# Altium footprint library ref-packages.PCBLIB: 1543 footprints (part 33 of 103)
Each footprint in its own frame and in the unit in brackets; x right, y up, seen from the top. Pads: shape width x height; smd on the part's side, far side on the other; paste and mask are expansions set on the pad; w line width, h text height; cw(c..) or ccw(c..) is an arc to the next point about the centre after c.
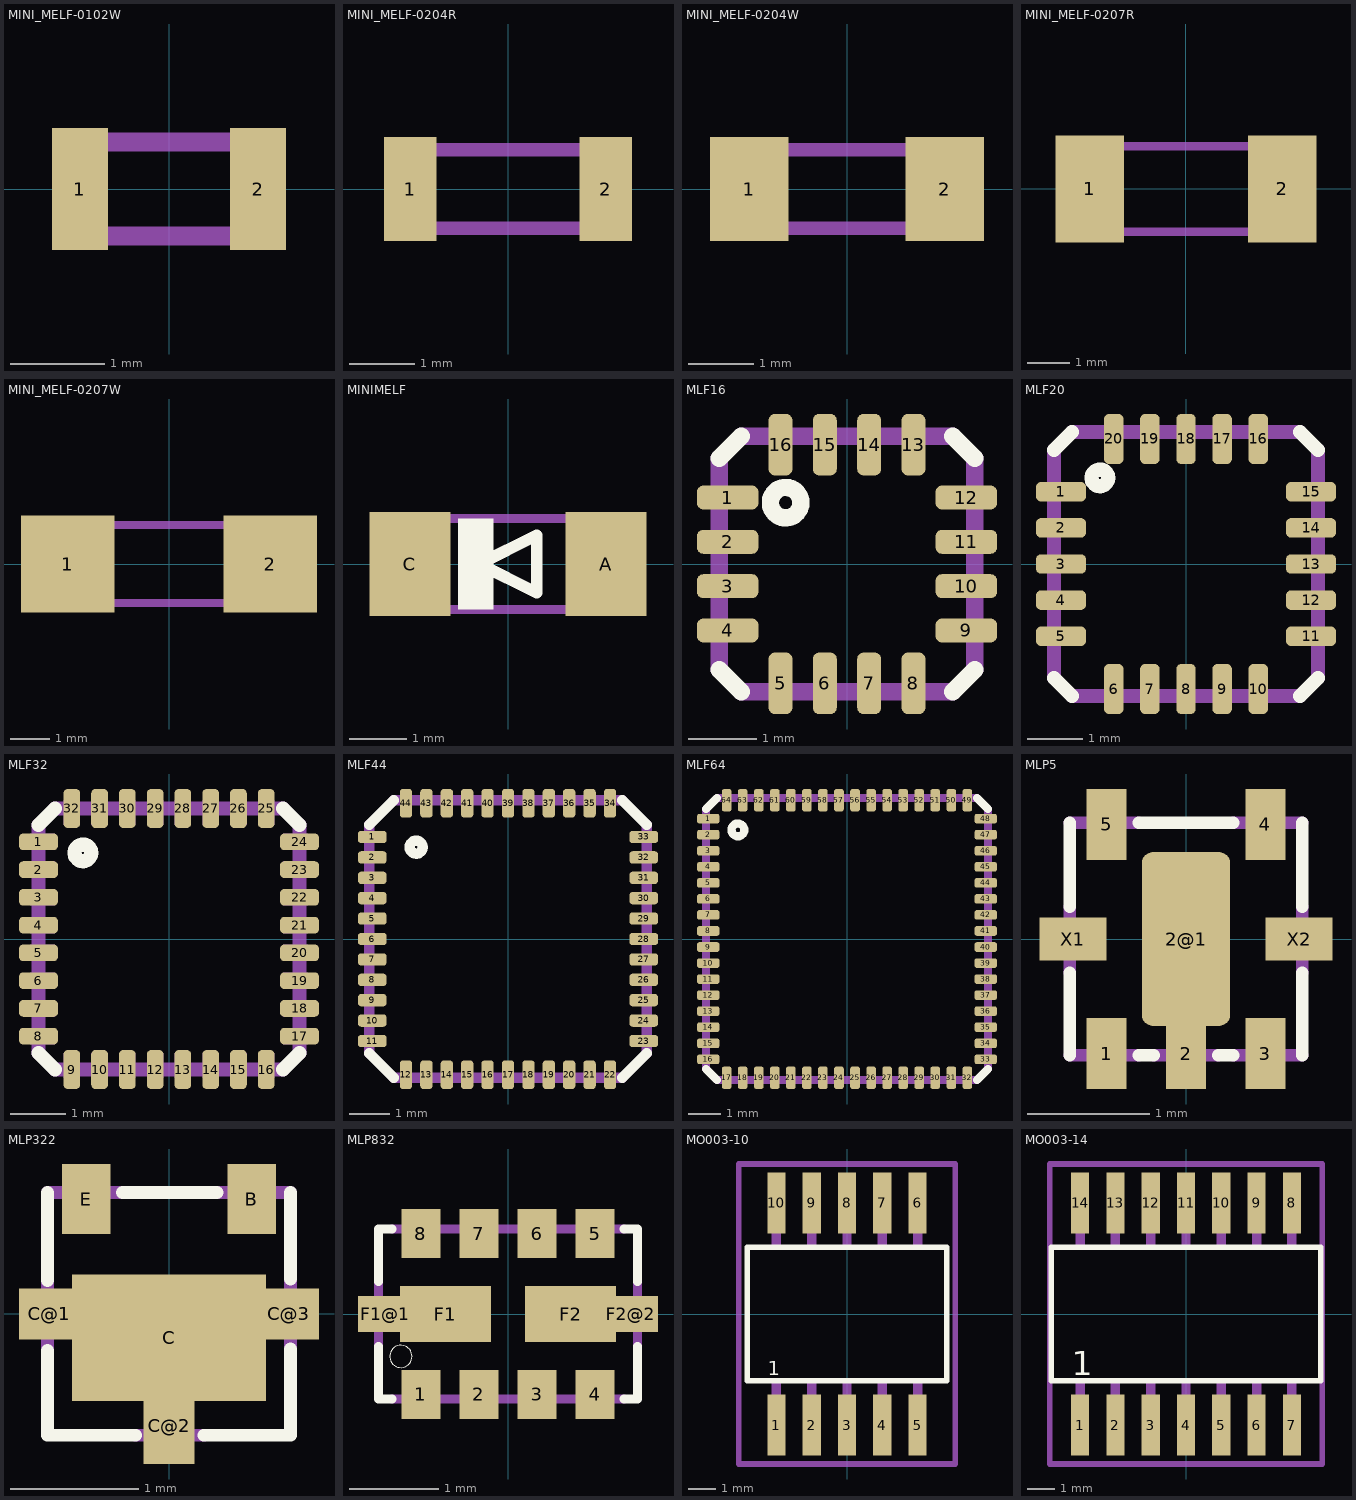
[diagram p32: the footprints below, top view; thin cyan lines are the x and y axes]

## MINI_MELF-0102W [mil]
pads (2):
  rect 23.62x51.18 smd: 1(-37.4,0) 2(37.4,0)
Mechanical 16:
  lines w8: -39.37,-19.69 39.37,-19.69 39.37,19.69 -39.37,19.69 -39.37,-19.69

## MINI_MELF-0204R [mil]
pads (2):
  rect 31.5x62.99 smd: 1(-59.06,0) 2(59.06,0)
Mechanical 16:
  lines w8: -66.93,-23.62 66.93,-23.62 66.93,23.62 -66.93,23.62 -66.93,-23.62

## MINI_MELF-0204W [mil]
pads (2):
  rect 47.24x62.99 smd: 1(-59.06,0) 2(59.06,0)
Mechanical 16:
  lines w8: -66.93,-23.62 66.93,-23.62 66.93,23.62 -66.93,23.62 -66.93,-23.62

## MINI_MELF-0207R [mil]
pads (2):
  rect 62.99x98.43 smd: 1(-88.58,0) 2(88.58,0)
Mechanical 16:
  lines w8: -110.24,-39.37 110.24,-39.37 110.24,39.37 -110.24,39.37 -110.24,-39.37

## MINI_MELF-0207W [mil]
pads (2):
  rect 94.49x98.43 smd: 1(-102.36,0) 2(102.36,0)
Mechanical 16:
  lines w8: -110.24,-39.37 110.24,-39.37 110.24,39.37 -110.24,39.37 -110.24,-39.37

## MINIMELF [mil]
pads (2):
  rect 55.12x70.87 smd: A(66.93,0) C(-66.93,0)
Top Overlay:
  rectangle: -34,-31 -10,31
  lines w8: -19.69,0 19.69,19.69 19.69,-19.69 -19.69,0
Mechanical 16:
  rectangle: -73,-34 -51,34
  rectangle: 51,-34 73,34
  lines w6: -52,-31 52,-31 ; -52,31 52,31

## MLF16 [mm]
pads (16):
  rrect50% 0.9x0.35 smd: 1(-1.75,0.975) 2(-1.75,0.325) 3(-1.75,-0.325) 4(-1.75,-0.975) 9(1.75,-0.975) 10(1.75,-0.325) 11(1.75,0.325) 12(1.75,0.975)
  rrect50% 0.35x0.9 smd: 5(-0.975,-1.75) 6(-0.325,-1.75) 7(0.325,-1.75) 8(0.975,-1.75) 13(0.975,1.75) 14(0.325,1.75) 15(-0.325,1.75) 16(-0.975,1.75)
Top Overlay:
  circle w0.254: c-0.9,0.9 r0.224
  lines w0.254: -1.875,-1.55 -1.55,-1.875 ; -1.875,1.55 -1.55,1.875 ; 1.55,-1.875 1.875,-1.55 ; 1.55,1.875 1.875,1.55
Mechanical 16:
  rectangle: -1.85,0.825 -1.4,1.125
  rectangle: -1.85,0.175 -1.4,0.475
  rectangle: -1.85,-0.475 -1.4,-0.175
  rectangle: -1.85,-1.125 -1.4,-0.825
  rectangle: -1.125,-1.85 -0.825,-1.4
  rectangle: -0.475,-1.85 -0.175,-1.4
  rectangle: 0.175,-1.85 0.475,-1.4
  rectangle: 0.825,-1.85 1.125,-1.4
  rectangle: 1.4,-1.125 1.85,-0.825
  rectangle: 1.4,-0.475 1.85,-0.175
  rectangle: 1.4,0.175 1.85,0.475
  rectangle: 1.4,0.825 1.85,1.125
  rectangle: 0.825,1.4 1.125,1.85
  rectangle: 0.175,1.4 0.475,1.85
  rectangle: -0.475,1.4 -0.175,1.85
  rectangle: -1.125,1.4 -0.825,1.85
  lines w0.254: -1.875,-1.55 -1.875,1.55 ; -1.55,-1.875 1.55,-1.875 ; -1.55,1.875 1.55,1.875 ; 1.875,-1.55 1.875,1.55

## MLF20 [mm]
pads (20):
  rrect50% 0.9x0.35 smd: 1(-2.25,1.3) 2(-2.25,0.65) 3(-2.25,0) 4(-2.25,-0.65) 5(-2.25,-1.3) 11(2.25,-1.3) 12(2.25,-0.65) 13(2.25,0) 14(2.25,0.65) 15(2.25,1.3)
  rrect50% 0.35x0.9 smd: 6(-1.3,-2.25) 7(-0.65,-2.25) 8(0,-2.25) 9(0.65,-2.25) 10(1.3,-2.25) 16(1.3,2.25) 17(0.65,2.25) 18(0,2.25) 19(-0.65,2.25) 20(-1.3,2.25)
Top Overlay:
  circle w0.254: c-1.55,1.55 r0.15
  lines w0.254: -2.375,-2.05 -2.05,-2.375 ; -2.375,2.05 -2.05,2.375 ; 2.05,-2.375 2.375,-2.05 ; 2.05,2.375 2.375,2.05
Mechanical 16:
  rectangle: -2.35,1.15 -1.9,1.45
  rectangle: -2.35,0.5 -1.9,0.8
  rectangle: -2.35,-0.15 -1.9,0.15
  rectangle: -2.35,-0.8 -1.9,-0.5
  rectangle: -2.35,-1.45 -1.9,-1.15
  rectangle: -1.45,-2.35 -1.15,-1.9
  rectangle: -0.8,-2.35 -0.5,-1.9
  rectangle: -0.15,-2.35 0.15,-1.9
  rectangle: 0.5,-2.35 0.8,-1.9
  rectangle: 1.15,-2.35 1.45,-1.9
  rectangle: 1.9,-1.45 2.35,-1.15
  rectangle: 1.9,-0.8 2.35,-0.5
  rectangle: 1.9,-0.15 2.35,0.15
  rectangle: 1.9,0.5 2.35,0.8
  rectangle: 1.9,1.15 2.35,1.45
  rectangle: 1.15,1.9 1.45,2.35
  rectangle: 0.5,1.9 0.8,2.35
  rectangle: -0.15,1.9 0.15,2.35
  rectangle: -0.8,1.9 -0.5,2.35
  rectangle: -1.45,1.9 -1.15,2.35
  lines w0.254: -2.375,-2.05 -2.375,2.05 ; -2.05,-2.375 2.05,-2.375 ; -2.05,2.375 2.05,2.375 ; 2.375,-2.05 2.375,2.05

## MLF32 [mm]
pads (32):
  rrect50% 0.7x0.3 smd: 1(-2.35,1.75) 2(-2.35,1.25) 3(-2.35,0.75) 4(-2.35,0.25) 5(-2.35,-0.25) 6(-2.35,-0.75) 7(-2.35,-1.25) 8(-2.35,-1.75) 17(2.35,-1.75) 18(2.35,-1.25) 19(2.35,-0.75) 20(2.35,-0.25) 21(2.35,0.25) 22(2.35,0.75) 23(2.35,1.25) 24(2.35,1.75)
  rrect50% 0.3x0.7 smd: 9(-1.75,-2.35) 10(-1.25,-2.35) 11(-0.75,-2.35) 12(-0.25,-2.35) 13(0.25,-2.35) 14(0.75,-2.35) 15(1.25,-2.35) 16(1.75,-2.35) 25(1.75,2.35) 26(1.25,2.35) 27(0.75,2.35) 28(0.25,2.35) 29(-0.25,2.35) 30(-0.75,2.35) 31(-1.25,2.35) 32(-1.75,2.35)
Top Overlay:
  circle w0.254: c-1.55,1.55 r0.15
  lines w0.254: -2.35,-2.05 -2.05,-2.35 ; -2.35,2.05 -2.05,2.35 ; 2.05,-2.35 2.35,-2.05 ; 2.05,2.35 2.35,2.05
Mechanical 16:
  rectangle: -2.5,1.6 -2.05,1.9
  rectangle: -2.5,1.1 -2.05,1.4
  rectangle: -2.5,0.6 -2.05,0.9
  rectangle: -2.5,0.1 -2.05,0.4
  rectangle: -2.5,-0.4 -2.05,-0.1
  rectangle: -2.5,-0.9 -2.05,-0.6
  rectangle: -2.5,-1.4 -2.05,-1.1
  rectangle: -2.5,-1.9 -2.05,-1.6
  rectangle: -1.9,-2.5 -1.6,-2.05
  rectangle: -1.4,-2.5 -1.1,-2.05
  rectangle: -0.9,-2.5 -0.6,-2.05
  rectangle: -0.4,-2.5 -0.1,-2.05
  rectangle: 0.1,-2.5 0.4,-2.05
  rectangle: 0.6,-2.5 0.9,-2.05
  rectangle: 1.1,-2.5 1.4,-2.05
  rectangle: 1.6,-2.5 1.9,-2.05
  rectangle: 2.05,-1.9 2.5,-1.6
  rectangle: 2.05,-1.4 2.5,-1.1
  rectangle: 2.05,-0.9 2.5,-0.6
  rectangle: 2.05,-0.4 2.5,-0.1
  rectangle: 2.05,0.1 2.5,0.4
  rectangle: 2.05,0.6 2.5,0.9
  rectangle: 2.05,1.1 2.5,1.4
  rectangle: 2.05,1.6 2.5,1.9
  rectangle: 1.6,2.05 1.9,2.5
  rectangle: 1.1,2.05 1.4,2.5
  rectangle: 0.6,2.05 0.9,2.5
  rectangle: 0.1,2.05 0.4,2.5
  rectangle: -0.4,2.05 -0.1,2.5
  rectangle: -0.9,2.05 -0.6,2.5
  rectangle: -1.4,2.05 -1.1,2.5
  rectangle: -1.9,2.05 -1.6,2.5
  lines w0.254: -2.35,-2.05 -2.35,2.05 ; -2.05,-2.35 2.05,-2.35 ; -2.05,2.35 2.05,2.35 ; 2.35,-2.05 2.35,2.05

## MLF44 [mm]
pads (44):
  rrect50% 0.7x0.3 smd: 1(-3.325,2.5) 2(-3.325,2) 3(-3.325,1.5) 4(-3.325,1) 5(-3.325,0.5) 6(-3.325,0) 7(-3.325,-0.5) 8(-3.325,-1) 9(-3.325,-1.5) 10(-3.325,-2) 11(-3.325,-2.5) 23(3.325,-2.5) 24(3.325,-2) 25(3.325,-1.5) 26(3.325,-1) 27(3.325,-0.5) 28(3.325,0) 29(3.325,0.5) 30(3.325,1) 31(3.325,1.5) 32(3.325,2) 33(3.325,2.5)
  rrect50% 0.3x0.7 smd: 12(-2.5,-3.325) 13(-2,-3.325) 14(-1.5,-3.325) 15(-1,-3.325) 16(-0.5,-3.325) 17(0,-3.325) 18(0.5,-3.325) 19(1,-3.325) 20(1.5,-3.325) 21(2,-3.325) 22(2.5,-3.325) 34(2.5,3.325) 35(2,3.325) 36(1.5,3.325) 37(1,3.325) 38(0.5,3.325) 39(0,3.325) 40(-0.5,3.325) 41(-1,3.325) 42(-1.5,3.325) 43(-2,3.325) 44(-2.5,3.325)
Top Overlay:
  circle w0.254: c-2.25,2.25 r0.158
  lines w0.254: -3.4,-2.8 -2.8,-3.4 ; -3.4,2.8 -2.8,3.4 ; 2.8,-3.4 3.4,-2.8 ; 2.8,3.4 3.4,2.8
Mechanical 16:
  rectangle: -3.5,2.375 -3,2.625
  rectangle: -3.5,1.875 -3,2.125
  rectangle: -3.5,1.375 -3,1.625
  rectangle: -3.5,0.875 -3,1.125
  rectangle: -3.5,0.375 -3,0.625
  rectangle: -3.5,-0.125 -3,0.125
  rectangle: -3.5,-0.625 -3,-0.375
  rectangle: -3.5,-1.125 -3,-0.875
  rectangle: -3.5,-1.625 -3,-1.375
  rectangle: -3.5,-2.125 -3,-1.875
  rectangle: -3.5,-2.625 -3,-2.375
  rectangle: -2.625,-3.5 -2.375,-3
  rectangle: -2.125,-3.5 -1.875,-3
  rectangle: -1.625,-3.5 -1.375,-3
  rectangle: -1.125,-3.5 -0.875,-3
  rectangle: -0.625,-3.5 -0.375,-3
  rectangle: -0.125,-3.5 0.125,-3
  rectangle: 0.375,-3.5 0.625,-3
  rectangle: 0.875,-3.5 1.125,-3
  rectangle: 1.375,-3.5 1.625,-3
  rectangle: 1.875,-3.5 2.125,-3
  rectangle: 2.375,-3.5 2.625,-3
  rectangle: 3,-2.625 3.5,-2.375
  rectangle: 3,-2.125 3.5,-1.875
  rectangle: 3,-1.625 3.5,-1.375
  rectangle: 3,-1.125 3.5,-0.875
  rectangle: 3,-0.625 3.5,-0.375
  rectangle: 3,-0.125 3.5,0.125
  rectangle: 3,0.375 3.5,0.625
  rectangle: 3,0.875 3.5,1.125
  rectangle: 3,1.375 3.5,1.625
  rectangle: 3,1.875 3.5,2.125
  rectangle: 3,2.375 3.5,2.625
  rectangle: 2.375,3 2.625,3.5
  rectangle: 1.875,3 2.125,3.5
  rectangle: 1.375,3 1.625,3.5
  rectangle: 0.875,3 1.125,3.5
  rectangle: 0.375,3 0.625,3.5
  rectangle: -0.125,3 0.125,3.5
  rectangle: -0.625,3 -0.375,3.5
  rectangle: -1.125,3 -0.875,3.5
  rectangle: -1.625,3 -1.375,3.5
  rectangle: -2.125,3 -1.875,3.5
  rectangle: -2.625,3 -2.375,3.5
  lines w0.254: -3.4,-2.8 -3.4,2.8 ; -2.8,-3.4 2.8,-3.4 ; -2.8,3.4 2.8,3.4 ; 3.4,-2.8 3.4,2.8

## MLF64 [mil]
pads (64):
  rrect50% 27.56x11.81 smd: 1(-170.28,147.64) 2(-170.28,127.95) 3(-170.28,108.27) 4(-170.28,88.58) 5(-170.28,68.9) 6(-170.28,49.21) 7(-170.28,29.53) 8(-170.28,9.84) 9(-170.28,-9.84) 10(-170.28,-29.53) 11(-170.28,-49.21) 12(-170.28,-68.9) 13(-170.28,-88.58) 14(-170.28,-108.27) 15(-170.28,-127.95) 16(-170.28,-147.64) 33(170.28,-147.64) 34(170.28,-127.95) 35(170.28,-108.27) 36(170.28,-88.58) 37(170.28,-68.9) 38(170.28,-49.21) 39(170.28,-29.53) 40(170.28,-9.84) 41(170.28,9.84) 42(170.28,29.53) 43(170.28,49.21) 44(170.28,68.9) 45(170.28,88.58) 46(170.28,108.27) 47(170.28,127.95) 48(170.28,147.64)
  rrect50% 11.81x27.56 smd: 17(-147.64,-170.28) 18(-127.95,-170.28) 19(-108.27,-170.28) 20(-88.58,-170.28) 21(-68.9,-170.28) 22(-49.21,-170.28) 23(-29.53,-170.28) 24(-9.84,-170.28) 25(9.84,-170.28) 26(29.53,-170.28) 27(49.21,-170.28) 28(68.9,-170.28) 29(88.58,-170.28) 30(108.27,-170.28) 31(127.95,-170.28) 32(147.64,-170.28) 49(147.64,170.28) 50(127.95,170.28) 51(108.27,170.28) 52(88.58,170.28) 53(68.9,170.28) 54(49.21,170.28) 55(29.53,170.28) 56(9.84,170.28) 57(-9.84,170.28) 58(-29.53,170.28) 59(-49.21,170.28) 60(-68.9,170.28) 61(-88.58,170.28) 62(-108.27,170.28) 63(-127.95,170.28) 64(-147.64,170.28)
Top Overlay:
  circle w10: c-133.86,133.86 r7.87
  lines w10: -173.23,-159.45 -159.45,-173.23 ; -173.23,159.45 -159.45,173.23 ; 159.45,-173.23 173.23,-159.45 ; 159.45,173.23 173.23,159.45
Mechanical 16:
  rectangle: -177.17,142.72 -157.48,152.56
  rectangle: -177.17,123.03 -157.48,132.87
  rectangle: -177.17,103.35 -157.48,113.19
  rectangle: -177.17,83.66 -157.48,93.5
  rectangle: -177.17,63.98 -157.48,73.82
  rectangle: -177.17,44.29 -157.48,54.13
  rectangle: -177.17,24.61 -157.48,34.45
  rectangle: -177.17,4.92 -157.48,14.76
  rectangle: -177.17,-14.76 -157.48,-4.92
  rectangle: -177.17,-34.45 -157.48,-24.61
  rectangle: -177.17,-54.13 -157.48,-44.29
  rectangle: -177.17,-73.82 -157.48,-63.98
  rectangle: -177.17,-93.5 -157.48,-83.66
  rectangle: -177.17,-113.19 -157.48,-103.35
  rectangle: -177.17,-132.87 -157.48,-123.03
  rectangle: -177.17,-152.56 -157.48,-142.72
  rectangle: -152.56,-177.17 -142.72,-157.48
  rectangle: -132.87,-177.17 -123.03,-157.48
  rectangle: -113.19,-177.17 -103.35,-157.48
  rectangle: -93.5,-177.17 -83.66,-157.48
  rectangle: -73.82,-177.17 -63.98,-157.48
  rectangle: -54.13,-177.17 -44.29,-157.48
  rectangle: -34.45,-177.17 -24.61,-157.48
  rectangle: -14.76,-177.17 -4.92,-157.48
  rectangle: 4.92,-177.17 14.76,-157.48
  rectangle: 24.61,-177.17 34.45,-157.48
  rectangle: 44.29,-177.17 54.13,-157.48
  rectangle: 63.98,-177.17 73.82,-157.48
  rectangle: 83.66,-177.17 93.5,-157.48
  rectangle: 103.35,-177.17 113.19,-157.48
  rectangle: 123.03,-177.17 132.87,-157.48
  rectangle: 142.72,-177.17 152.56,-157.48
  rectangle: 157.48,-152.56 177.17,-142.72
  rectangle: 157.48,-132.87 177.17,-123.03
  rectangle: 157.48,-113.19 177.17,-103.35
  rectangle: 157.48,-93.5 177.17,-83.66
  rectangle: 157.48,-73.82 177.17,-63.98
  rectangle: 157.48,-54.13 177.17,-44.29
  rectangle: 157.48,-34.45 177.17,-24.61
  rectangle: 157.48,-14.76 177.17,-4.92
  rectangle: 157.48,4.92 177.17,14.76
  rectangle: 157.48,24.61 177.17,34.45
  rectangle: 157.48,44.29 177.17,54.13
  rectangle: 157.48,63.98 177.17,73.82
  rectangle: 157.48,83.66 177.17,93.5
  rectangle: 157.48,103.35 177.17,113.19
  rectangle: 157.48,123.03 177.17,132.87
  rectangle: 157.48,142.72 177.17,152.56
  rectangle: 142.72,157.48 152.56,177.17
  rectangle: 123.03,157.48 132.87,177.17
  rectangle: 103.35,157.48 113.19,177.17
  rectangle: 83.66,157.48 93.5,177.17
  rectangle: 63.98,157.48 73.82,177.17
  rectangle: 44.29,157.48 54.13,177.17
  rectangle: 24.61,157.48 34.45,177.17
  rectangle: 4.92,157.48 14.76,177.17
  rectangle: -14.76,157.48 -4.92,177.17
  rectangle: -34.45,157.48 -24.61,177.17
  rectangle: -54.13,157.48 -44.29,177.17
  rectangle: -73.82,157.48 -63.98,177.17
  rectangle: -93.5,157.48 -83.66,177.17
  rectangle: -113.19,157.48 -103.35,177.17
  rectangle: -132.87,157.48 -123.03,177.17
  rectangle: -152.56,157.48 -142.72,177.17
  lines w10: -173.23,-159.45 -173.23,159.45 ; -159.45,-173.23 159.45,-173.23 ; -159.45,173.23 159.45,173.23 ; 173.23,-159.45 173.23,159.45

## MLP5 [mm]
pads (8):
  rect 0.33x0.58 smd: 1(-0.65,-0.938) 2(0,-0.938) 3(0.65,-0.938) 4(0.65,0.938) 5(-0.65,0.938)
  rrect25% 0.724x1.424 smd: 2@1(0,0)
  rect 0.55x0.35 smd: X1(-0.925,0) X2(0.925,0)
Top Overlay:
  lines w0.102: -0.95,-0.95 -0.95,-0.275 ; -0.95,0.262 -0.95,0.95 ; -0.388,-0.95 -0.262,-0.95 ; -0.388,0.95 0.388,0.95 ; 0.262,-0.95 0.388,-0.95 ; 0.95,-0.95 0.95,-0.275 ; 0.95,0.262 0.95,0.95
Mechanical 16:
  circle w0: c-0.65,0.825 r0.137
  circle w0: c0.65,0.825 r0.137
  circle w0: c0.65,-0.825 r0.137
  circle w0: c-0.65,-0.825 r0.137
  rectangle: -0.787,0.813 -0.513,1.125
  rectangle: 0.513,0.813 0.787,1.125
  rectangle: 0.513,-1.125 0.787,-0.813
  rectangle: -0.787,-1.125 -0.513,-0.813
  rectangle: -0.137,-1.125 0.137,-0.7
  rectangle: -1.125,-0.15 -0.725,0.15
  rectangle: 0.725,-0.15 1.125,0.15
  lines w0.102: -0.95,-0.95 -0.388,-0.95 ; -0.95,-0.275 -0.95,0.262 ; -0.95,0.95 -0.388,0.95 ; -0.262,-0.95 0.262,-0.95 ; 0.388,-0.95 0.95,-0.95 ; 0.388,0.95 0.95,0.95 ; 0.95,-0.275 0.95,0.262

## MLP322 [mm]
pads (6):
  rect 0.38x0.55 smd: B(0.65,0.9) E(-0.65,0.9)
  rect 1.52x0.99 smd: C(0,-0.187)
  rect 0.475x0.4 smd: C@1(-0.938,0) C@3(0.938,0)
  rect 0.4x0.6 smd: C@2(0,-0.875)
Top Overlay:
  lines w0.102: -0.95,-0.288 -0.95,-0.95 -0.262,-0.95 ; -0.95,0.262 -0.95,0.95 ; -0.362,0.95 0.375,0.95 ; 0.275,-0.95 0.95,-0.95 0.95,-0.275 ; 0.95,0.275 0.95,0.95
Mechanical 16:
  rectangle: 0.513,0.675 0.787,1.125
  rectangle: -0.787,0.675 -0.513,1.125
  rectangle: -1.125,-0.15 -0.75,0.15
  rectangle: 0.75,-0.15 1.125,0.15
  rectangle: -0.15,-1.125 0.15,-0.675
  lines w0.102: -0.95,-0.288 -0.95,0.262 ; -0.95,0.95 -0.362,0.95 ; -0.262,-0.95 0.275,-0.95 ; 0.375,0.95 0.95,0.95 ; 0.95,-0.275 0.95,0.275

## MLP832 [mil]
pads (12):
  rect 17.32x21.65 smd: 1(-38.39,-35.43) 2(-12.8,-35.43) 3(12.8,-35.43) 4(38.39,-35.43) 5(38.39,35.43) 6(12.8,35.43) 7(-12.8,35.43) 8(-38.39,35.43)
  rect 40.16x24.8 smd: F1(-27.56,0) F2(27.56,0)
  rect 24.02x15.75 smd: F1@1(-54.13,0) F2@2(54.13,0)
Top Overlay:
  circle w0: c-47.24,-18.7 r4.92
  lines w4: -57.09,-14.27 -57.09,-37.4 -51.18,-37.4 ; -57.09,14.27 -57.09,37.4 -51.18,37.4 ; 51.18,-37.4 57.09,-37.4 57.09,-14.27 ; 51.18,37.4 57.09,37.4 57.09,14.27
Mechanical 16:
  rectangle: -44.78,26.57 -31.99,44.29
  rectangle: -19.19,26.57 -6.4,44.29
  rectangle: 6.4,26.57 19.19,44.29
  rectangle: 31.99,26.57 44.78,44.29
  rectangle: 31.99,-44.29 44.78,-26.57
  rectangle: 6.4,-44.29 19.19,-26.57
  rectangle: -19.19,-44.29 -6.4,-26.57
  rectangle: -44.78,-44.29 -31.99,-26.57
  rectangle: -63.98,-5.91 -58.56,5.91
  rectangle: 58.56,-5.91 63.98,5.91
  lines w4: -57.09,-14.27 -57.09,14.27 ; -51.18,-37.4 51.18,-37.4 ; -51.18,37.4 51.18,37.4 ; 57.09,-14.76 57.09,14.27

## MO003-10 [mm]
pads (10):
  rect 0.65x2.2 smd: 1(-2.54,-4) 2(-1.27,-4) 3(0,-4) 4(1.27,-4) 5(2.54,-4) 6(2.54,4) 7(1.27,4) 8(0,4) 9(-1.27,4) 10(-2.54,4)
Top Overlay:
  lines w0.203: -3.585,-2.4 3.585,-2.4 3.585,2.4 -3.585,2.4 -3.585,-2.4
  text "1" at -2.851,-2.205 h0.52
Mechanical 16:
  rectangle: -2.71,-4.8 -2.37,-2.4
  rectangle: -1.44,-4.8 -1.1,-2.4
  rectangle: -0.17,-4.8 0.17,-2.4
  rectangle: 1.1,-4.8 1.44,-2.4
  rectangle: 2.37,-4.8 2.71,-2.4
  rectangle: 2.37,2.4 2.71,4.8
  rectangle: 1.1,2.4 1.44,4.8
  rectangle: -0.17,2.4 0.17,4.8
  rectangle: -1.44,2.4 -1.1,4.8
  rectangle: -2.71,2.4 -2.37,4.8
Mechanical 27:
  lines w0.2: -3.9,-5.4 -3.9,5.4 3.9,5.4 3.9,-5.4 -3.9,-5.4

## MO003-14 [mm]
pads (14):
  rect 0.65x2.2 smd: 1(-3.81,-4) 2(-2.54,-4) 3(-1.27,-4) 4(0,-4) 5(1.27,-4) 6(2.54,-4) 7(3.81,-4) 8(3.81,4) 9(2.54,4) 10(1.27,4) 11(0,4) 12(-1.27,4) 13(-2.54,4) 14(-3.81,4)
Top Overlay:
  lines w0.203: -4.855,-2.4 4.855,-2.4 4.855,2.4 -4.855,2.4 -4.855,-2.4
  text "1" at -4.121,-2.205 h0.86
Mechanical 16:
  rectangle: -3.98,-4.8 -3.64,-2.4
  rectangle: -2.71,-4.8 -2.37,-2.4
  rectangle: -1.44,-4.8 -1.1,-2.4
  rectangle: -0.17,-4.8 0.17,-2.4
  rectangle: 1.1,-4.8 1.44,-2.4
  rectangle: 2.37,-4.8 2.71,-2.4
  rectangle: 3.64,-4.8 3.98,-2.4
  rectangle: 3.64,2.4 3.98,4.8
  rectangle: 2.37,2.4 2.71,4.8
  rectangle: 1.1,2.4 1.44,4.8
  rectangle: -0.17,2.4 0.17,4.8
  rectangle: -1.44,2.4 -1.1,4.8
  rectangle: -2.71,2.4 -2.37,4.8
  rectangle: -3.98,2.4 -3.64,4.8
Mechanical 27:
  lines w0.2: -4.9,-5.4 -4.9,5.4 4.9,5.4 4.9,-5.4 -4.9,-5.4